# Altium footprint library TarabusLibrary.PcbLib: 591 footprints (part 2 of 37)
Each footprint in its own frame and in the unit in brackets; x right, y up, seen from the top. Pads: shape width x height; smd on the part's side, far side on the other; paste and mask are expansions set on the pad; w line width, h text height; cw(c..) or ccw(c..) is an arc to the next point about the centre after c.
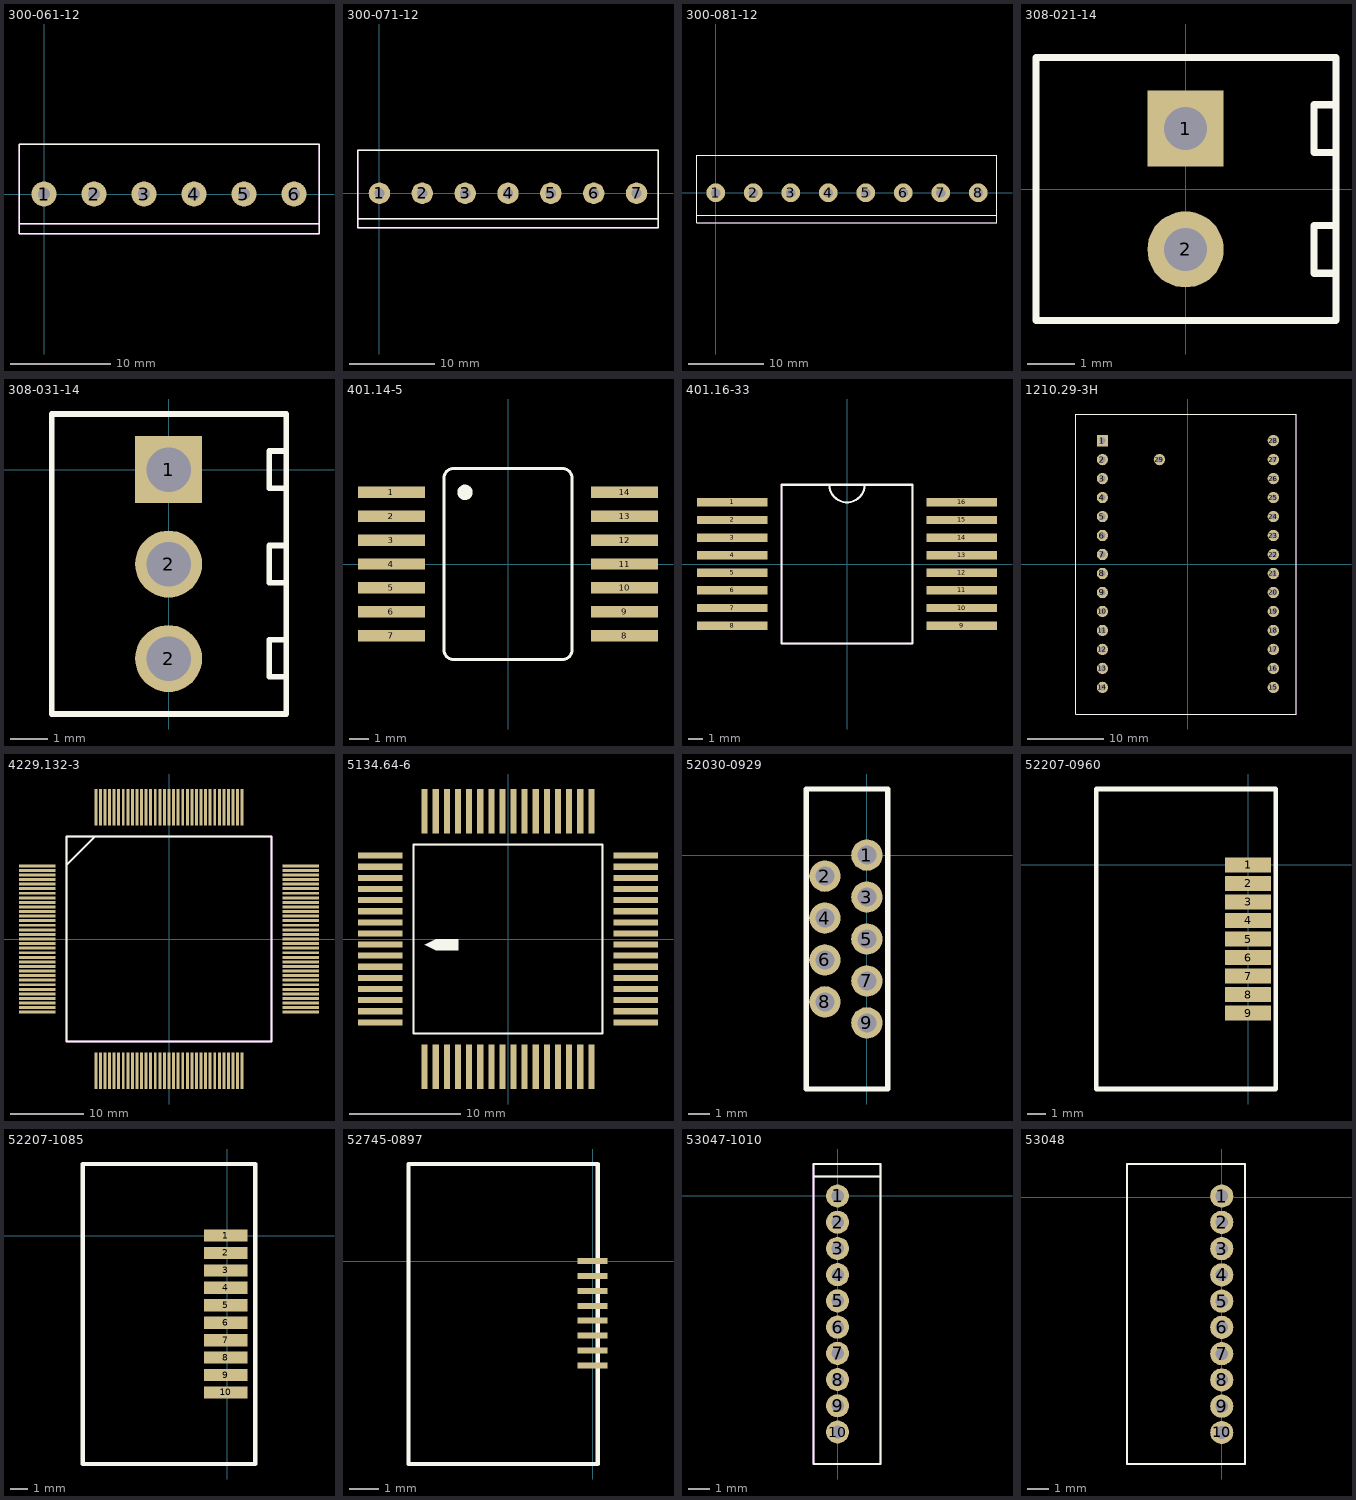
[diagram p1: the footprints below, top view; thin cyan lines are the x and y axes]

## 300-061-12 [mm]
pads (6):
  round 2.5 hole 1.2: 1(0,0) 2(5,0) 3(10,0) 4(15,0) 5(20,0) 6(25,0)
Top Overlay:
  lines w0.15: -2.5,-3 27.5,-3 ; -2.5,-4 27.5,-4 27.5,5 -2.5,5 -2.5,-4
Mechanical 7:
  lines w0.15: -2.5,-3 27.5,-3 ; -2.5,-4 -2.5,5 27.5,5 27.5,-4 -2.5,-4
Mechanical 10:
  text ".Designator" at 4.52,5.25 h0.8
  text ".Comment" at 5.52,-4.71 h0.6
3D body: height 12.5, standoff 0, extent -2.5,-4 27.5,5

## 300-071-12 [mm]
pads (7):
  round 2.5 hole 1.2: 1(0,0) 2(5,0) 3(10,0) 4(15,0) 5(20,0) 6(25,0) 7(30,0)
Top Overlay:
  lines w0.15: -2.5,-3 32.5,-3 ; -2.5,-4 -2.5,5 32.5,5 32.5,-4 -2.5,-4
Mechanical 7:
  lines w0.15: -2.5,-3 32.5,-3 ; -2.5,-4 32.5,-4 32.5,5 -2.5,5 -2.5,-4
Mechanical 10:
  text ".Comment" at 5.52,-4.71 h0.6
  text ".Designator" at 4.52,5.25 h0.8
3D body: height 12.5, standoff 0, extent -2.5,-4 32.5,5

## 300-081-12 [mm]
pads (8):
  round 2.5 hole 1.2: 1(0,0) 2(5,0) 3(10,0) 4(15,0) 5(20,0) 6(25,0) 7(30,0) 8(35,0)
Top Overlay:
  lines w0.15: -2.5,-3 37.5,-3 ; -2.5,-4 -2.5,5 37.5,5 37.5,-4 -2.5,-4
Mechanical 7:
  lines w0.15: -2.5,-3 37.5,-3 ; -2.5,-4 37.5,-4 37.5,5 -2.5,5 -2.5,-4
Mechanical 10:
  text ".Comment" at 5.52,-4.71 h0.6
  text ".Designator" at 4.52,5.25 h0.8
3D body: height 12.5, standoff 0, extent -2.5,-4 37.5,5

## 308-021-14 [mm]
height 8.5
pads (2):
  rect 1.6x1.6 hole 0.9: 1(0,1.27)
  round 1.6 hole 0.9: 2(0,-1.27)
Top Overlay:
  lines w0.15: 3.16,-1.77 2.7,-1.77 2.7,-0.77 3.16,-0.77 ; 3.16,0.77 2.7,0.77 2.7,1.77 3.16,1.77 ; -3.14,-2.765 -3.14,2.765 3.16,2.765 3.16,-2.765 -3.14,-2.765
Mechanical 7:
  lines w0.1: 3.16,-1.77 2.7,-1.77 2.7,-0.77 3.16,-0.77 ; 3.16,0.77 2.7,0.77 2.7,1.77 3.16,1.77 ; -3.14,-2.765 3.16,-2.765 3.16,2.765 -3.14,2.765 -3.14,-2.765
Mechanical 10:
  text ".Comment" at -1.15,3.275 h0.6
  text ".Designator" at -1.175,3.975 h0.8
3D body: height 8.5, standoff 0, extent -3.14,-2.765 3.16,2.765

## 308-031-14 [mm]
height 8.5
pads (3):
  rect 1.8x1.8 hole 1.2: 1(0,0)
  round 1.8 hole 1.2: 2(0,-5.08) 2(0,-2.54)
Top Overlay:
  lines w0.15: 3.16,-5.57 2.7,-5.57 2.7,-4.57 3.16,-4.57 ; 3.16,-3.04 2.7,-3.04 2.7,-2.04 3.16,-2.04 ; 3.16,-0.5 2.7,-0.5 2.7,0.5 3.16,0.5 ; -3.14,-6.57 3.16,-6.57 3.16,1.495 -3.14,1.495 -3.14,-6.57
Mechanical 7:
  lines w0.1: 3.16,-5.57 2.7,-5.57 2.7,-4.57 3.16,-4.57 ; 3.16,-3.04 2.7,-3.04 2.7,-2.04 3.16,-2.04 ; 3.16,-0.5 2.7,-0.5 2.7,0.5 3.16,0.5 ; -3.14,-6.57 -3.14,1.495 3.16,1.495 3.16,-6.57 -3.14,-6.57
Mechanical 10:
  text ".Designator" at -1.175,2.705 h0.8
  text ".Comment" at -1.15,2.005 h0.6
3D body: height 8.5, standoff 0, extent -3.14,-6.57 3.16,1.495

## 401.14-5 [mm]
pads (14):
  rect 3.5x0.6 smd: 1(-6.1,3.75) 2(-6.1,2.5) 3(-6.1,1.25) 4(-6.1,0) 5(-6.1,-1.25) 6(-6.1,-2.5) 7(-6.1,-3.75) 8(6.1,-3.75) 9(6.1,-2.5) 10(6.1,-1.25) 11(6.1,0) 12(6.1,1.25) 13(6.1,2.5) 14(6.1,3.75)
Top Overlay:
  circle w0.4: c-2.25,3.75 r0.2
  lines w0.15: -3.35,-4.5 ccw(c-2.85,-4.5) -2.85,-5 2.85,-5 ccw(c2.85,-4.5) 3.35,-4.5 3.35,4.5 ccw(c2.85,4.5) 2.85,5 -2.85,5 ccw(c-2.85,4.5) -3.35,4.5 -3.35,-4.5
Mechanical 7:
  circle w0.2: c-2.25,3.75 r0.1
  lines w0.1: -3.35,-4.5 ccw(c-2.85,-4.5) -2.85,-5 2.85,-5 ccw(c2.85,-4.5) 3.35,-4.5 3.35,4.5 ccw(c2.85,4.5) 2.85,5 -2.85,5 ccw(c-2.85,4.5) -3.35,4.5 -3.35,-4.5
Mechanical 10:
  text ".Designator" at -0.28,5.57 h0.8
3D body: height 3, standoff 0.05, extent -3.35,-5 3.35,5

## 401.16-33 [mm]
pads (16):
  rect 5x0.6 smd: 1(-8.15,4.375) 2(-8.15,3.125) 3(-8.15,1.875) 4(-8.15,0.625) 5(-8.15,-0.625) 6(-8.15,-1.875) 7(-8.15,-3.125) 8(-8.15,-4.375) 9(8.15,-4.375) 10(8.15,-3.125) 11(8.15,-1.875) 12(8.15,-0.625) 13(8.15,0.625) 14(8.15,1.875) 15(8.15,3.125) 16(8.15,4.375)
Top Overlay:
  lines w0.15: -1.25,5.625 ccw(c0,5.625) 1.25,5.625 ; -4.65,-5.651 -4.65,5.625 4.65,5.625 4.65,-5.651 -4.65,-5.651
Mechanical 7:
  lines w0.1: -1.25,5.625 ccw(c0,5.625) 1.25,5.625 ; -4.65,-5.651 4.65,-5.651 4.65,5.625 -4.65,5.625 -4.65,-5.651
  text ".Designator" at -0.88,6.51 h0.8

## 1210.29-3Н [mm]
pads (29):
  rect 1.5x1.5 hole 0.8: 1(-11.25,16.25)
  round 1.5 hole 0.8: 2(-11.25,13.75) 3(-11.25,11.25) 4(-11.25,8.75) 5(-11.25,6.25) 6(-11.25,3.75) 7(-11.25,1.25) 8(-11.25,-1.25) 9(-11.25,-3.75) 10(-11.25,-6.25) 11(-11.25,-8.75) 12(-11.25,-11.25) 13(-11.25,-13.75) 14(-11.25,-16.25) 15(11.25,-16.25) 16(11.25,-13.75) 17(11.25,-11.25) 18(11.25,-8.75) 19(11.25,-6.25) 20(11.25,-3.75) 21(11.25,-1.25) 22(11.25,1.25) 23(11.25,3.75) 24(11.25,6.25) 25(11.25,8.75) 26(11.25,11.25) 27(11.25,13.75) 28(11.25,16.25) 29(-3.75,13.75)
Top Overlay:
  lines w0.15: -14.75,-19.75 -14.75,19.75 14.25,19.75 14.25,-19.75 -14.75,-19.75
Mechanical 7:
  lines w0.1: -14.75,-19.75 14.25,-19.75 14.25,19.75 -14.75,19.75 -14.75,-19.75
  text ".Designator" at -0.4,2.09 h0.8

## 4229.132-3 [mm]
height 3.4
pads (132):
  rect 5x0.4 smd: 1(-18,10) 2(-18,9.375) 3(-18,8.75) 4(-18,8.125) 5(-18,7.5) 6(-18,6.875) 7(-18,6.25) 8(-18,5.625) 9(-18,5) 10(-18,4.375) 11(-18,3.75) 12(-18,3.125) 13(-18,2.5) 14(-18,1.875) 15(-18,1.25) 16(-18,0.625) 17(-18,0) 18(-18,-0.625) 19(-18,-1.25) 20(-18,-1.875) 21(-18,-2.5) 22(-18,-3.125) 23(-18,-3.75) 24(-18,-4.375) 25(-18,-5) 26(-18,-5.625) 27(-18,-6.25) 28(-18,-6.875) 29(-18,-7.5) 30(-18,-8.125) 31(-18,-8.75) 32(-18,-9.375) 33(-18,-10) 67(18,-10) 68(18,-9.375) 69(18,-8.75) 70(18,-8.125) 71(18,-7.5) 72(18,-6.875) 73(18,-6.25) 74(18,-5.625) 75(18,-5) 76(18,-4.375) 77(18,-3.75) 78(18,-3.125) 79(18,-2.5) 80(18,-1.875) 81(18,-1.25) 82(18,-0.625) 83(18,0) 84(18,0.625) 85(18,1.25) 86(18,1.875) 87(18,2.5) 88(18,3.125) 89(18,3.75) 90(18,4.375) 91(18,5) 92(18,5.625) 93(18,6.25) 94(18,6.875) 95(18,7.5) 96(18,8.125) 97(18,8.75) 98(18,9.375) 99(18,10)
  rect 0.4x5 smd: 34(-10,-18) 35(-9.375,-18) 36(-8.75,-18) 37(-8.125,-18) 38(-7.5,-18) 39(-6.875,-18) 40(-6.25,-18) 41(-5.625,-18) 42(-5,-18) 43(-4.375,-18) 44(-3.75,-18) 45(-3.125,-18) 46(-2.5,-18) 47(-1.875,-18) 48(-1.25,-18) 49(-0.625,-18) 50(0,-18) 51(0.625,-18) 52(1.25,-18) 53(1.875,-18) 54(2.5,-18) 55(3.125,-18) 56(3.75,-18) 57(4.375,-18) 58(5,-18) 59(5.625,-18) 60(6.25,-18) 61(6.875,-18) 62(7.5,-18) 63(8.125,-18) 64(8.75,-18) 65(9.375,-18) 66(10,-18) 100(10,18) 101(9.375,18) 102(8.75,18) 103(8.125,18) 104(7.5,18) 105(6.875,18) 106(6.25,18) 107(5.625,18) 108(5,18) 109(4.375,18) 110(3.75,18) 111(3.125,18) 112(2.5,18) 113(1.875,18) 114(1.25,18) 115(0.625,18) 116(0,18) 117(-0.625,18) 118(-1.25,18) 119(-1.875,18) 120(-2.5,18) 121(-3.125,18) 122(-3.75,18) 123(-4.375,18) 124(-5,18) 125(-5.625,18) 126(-6.25,18) 127(-6.875,18) 128(-7.5,18) 129(-8.125,18) 130(-8.75,18) 131(-9.375,18) 132(-10,18)
Top Overlay:
  lines w0.254: -14,10.175 -10.175,14 -9.975,14 ; -14,-14 -14,14 14,14 14,-14 -14,-14
Mechanical 7:
  lines w0.254: -14,10.175 -10.175,14 -9.975,14 ; -14,-14 14,-14 14,14 -14,14 -14,-14
3D body: height 3.4, standoff 0.05, extent -14,-14 14,14

## 5134.64-6 [mm]
pads (64):
  rect 4x0.55 smd: 1(-11.5,-0.5) 2(-11.5,-1.5) 3(-11.5,-2.5) 4(-11.5,-3.5) 5(-11.5,-4.5) 6(-11.5,-5.5) 7(-11.5,-6.5) 8(-11.5,-7.5) 25(11.5,-7.5) 26(11.5,-6.5) 27(11.5,-5.5) 28(11.5,-4.5) 29(11.5,-3.5) 30(11.5,-2.5) 31(11.5,-1.5) 32(11.5,-0.5) 33(11.5,0.5) 34(11.5,1.5) 35(11.5,2.5) 36(11.5,3.5) 37(11.5,4.5) 38(11.5,5.5) 39(11.5,6.5) 40(11.5,7.5) 57(-11.5,7.5) 58(-11.5,6.5) 59(-11.5,5.5) 60(-11.5,4.5) 61(-11.5,3.5) 62(-11.5,2.5) 63(-11.5,1.5) 64(-11.5,0.5)
  rect 0.55x4 smd: 9(-7.5,-11.5) 10(-6.5,-11.5) 11(-5.5,-11.5) 12(-4.5,-11.5) 13(-3.5,-11.5) 14(-2.5,-11.5) 15(-1.5,-11.5) 16(-0.5,-11.5) 17(0.5,-11.5) 18(1.5,-11.5) 19(2.5,-11.5) 20(3.5,-11.5) 21(4.5,-11.5) 22(5.5,-11.5) 23(6.5,-11.5) 24(7.5,-11.5) 41(7.5,11.5) 42(6.5,11.5) 43(5.5,11.5) 44(4.5,11.5) 45(3.5,11.5) 46(2.5,11.5) 47(1.5,11.5) 48(0.5,11.5) 49(-0.5,11.5) 50(-1.5,11.5) 51(-2.5,11.5) 52(-3.5,11.5) 53(-4.5,11.5) 54(-5.5,11.5) 55(-6.5,11.5) 56(-7.5,11.5)
Top Overlay:
  region: -6.5,-1 -4.5,-1 -4.5,0 -6.5,0 -7.5,-0.5
  lines w0.15: -8.5,-8.5 8.5,-8.5 8.5,8.5 -8.5,8.5 -8.5,-8.5
Mechanical 7:
  region: -6.5,-0.85 -5.5,-0.85 -5.5,-0.15 -6.51,-0.15 -7.5,-0.5
  lines w0.1: -8.5,-8.5 -8.5,8.5 8.5,8.5 8.5,-8.5 -8.5,-8.5
  text ".Designator" at -0.32,1.25 h0.8

## 52030-0929 [mm] "Molex"
pads (9):
  round 1.5 hole 0.9 mask+0: 1(0,0) 2(-2,-1) 3(0,-2) 4(-2,-3) 5(0,-4) 6(-2,-5) 7(0,-6) 8(-2,-7) 9(0,-8)
Top Overlay:
  lines w0.254: -2.9,-11.15 1,-11.15 1,3.15 -2.9,3.15 -2.9,-11.15
3D body "520300929.stp": height 6.7, standoff -3.2, extent -2.7,-11.15 0.8,3.15

## 52207-0960 [mm]
pads (9):
  rect 2.5x0.8 smd mask+0: 1(0,0) 2(0,-1) 3(0,-2) 4(0,-3) 5(0,-4) 6(0,-5) 7(0,-6) 8(0,-7) 9(0,-8)
Top Overlay:
  lines w0.254: -8.2,-12.1 -8.2,4.1 1.5,4.1 1.5,-12.1 -8.2,-12.1
3D body "5545.stp": height 2.65, standoff -0.05, extent -7.9,-11.65 1,3.65

## 52207-1085 [mm]
pads (10):
  rect 2.5x0.7 smd mask+0: 1(-0.1,0) 2(-0.1,-1) 3(-0.1,-2) 4(-0.1,-3) 5(-0.1,-4) 6(-0.1,-5) 7(-0.1,-6) 8(-0.1,-7) 9(-0.1,-8) 10(-0.1,-9)
Top Overlay:
  lines w0.254: -8.3,-13.1 -8.3,4.1 1.6,4.1 1.6,-13.1 -8.3,-13.1
3D body "5547.stp": height 2.75, standoff 0.05, extent -8,-12.65 0.9,3.65

## 52745-0897 [mm]
pads (8):
  rect 1x0.2 smd mask+0: 1(0,0) 2(0,-0.5) 3(0,-1) 4(0,-1.5) 5(0,-2) 6(0,-2.5) 7(0,-3) 8(0,-3.5)
Top Overlay:
  lines w0.15: -6.18,-6.81 0.18,-6.81 0.18,3.26 -6.18,3.26 -6.18,-6.81
3D body "527450897.stp": height 2, standoff 0, extent -6.18,-6.81 0.22,3.29

## 53047-1010 [mm]
pads (10):
  round 1.1 hole 0.6 mask+0: 1(0,0) 2(0,-1.25) 3(0,-2.5) 4(0,-3.75) 5(0,-5) 6(0,-6.25) 7(0,-7.5) 8(0,-8.75) 9(0,-10) 10(0,-11.25)
Top Overlay:
  lines w0.1: -1.15,0.925 2.05,0.925 ; -1.15,-12.775 -1.15,1.525 2.05,1.525 2.05,-12.775 -1.15,-12.775
Mechanical 7:
  lines w0.1: -1.15,0.925 2.05,0.925 ; -1.15,-12.775 2.05,-12.775 2.05,1.525 -1.15,1.525 -1.15,-12.775
3D body "530471010.stp": height 4.1, standoff -2.3, extent -1.2,-12.725 2,1.525

## 53048 [mm]
pads (10):
  round 1.1 hole 0.6 mask+0: 1(0,0.05) 2(0,-1.2) 3(0,-2.45) 4(0,-3.7) 5(0,-4.95) 6(0,-6.2) 7(0,-7.45) 8(0,-8.7) 9(0,-9.95) 10(0,-11.2)
Top Overlay:
  lines w0.1: -4.5,-12.7 -4.5,1.575 1.1,1.575 1.1,-12.7 -4.5,-12.7
Mechanical 7:
  lines w0.1: -4.5,-12.7 1.1,-12.7 1.1,1.575 -4.5,1.575 -4.5,-12.7
3D body "5738.stp": height 1.75, standoff -4.05, extent -4.45,-12.625 1.05,1.625